# Altium footprint library 3M THD.PcbLib: 163 footprints (part 10 of 14)
Each footprint in its own frame and in the unit in brackets; x right, y up, seen from the top. Pads: shape width x height; smd on the part's side, far side on the other; paste and mask are expansions set on the pad; w line width, h text height; cw(c..) or ccw(c..) is an arc to the next point about the centre after c.
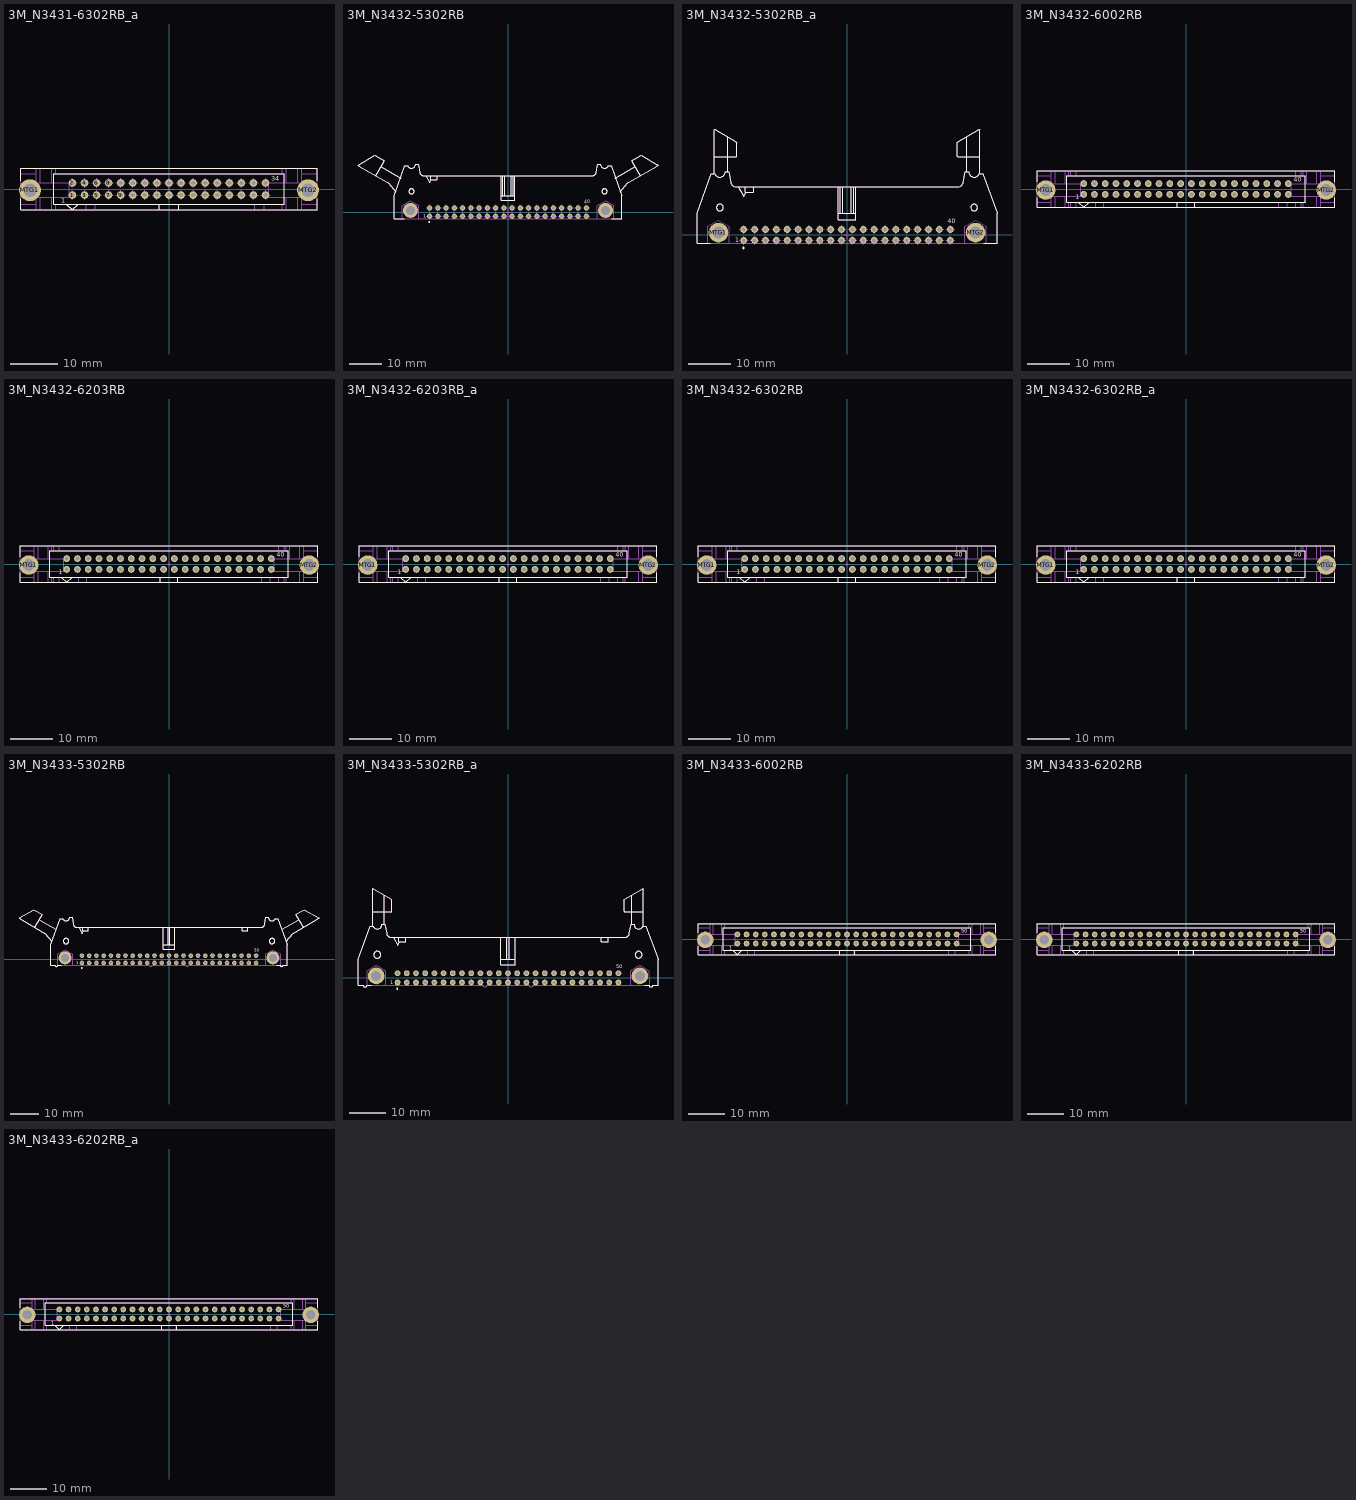
[diagram p9: the footprints below, top view; thin cyan lines are the x and y axes]

## 3M_N3431-6302RB_a [mm] "3M, 3000 Series, 34 Contacts - Pitch 2.54mm - Straight Four-Wall Header (Black) With Long Roll Pin Latch/Ejectors"
height 27.2
pads (36):
  round 1.6 hole 0.9: 1(-20.32,-1.27) 2(-20.32,1.27) 3(-17.78,-1.27) 4(-17.78,1.27) 5(-15.24,-1.27) 6(-15.24,1.27) 7(-12.7,-1.27) 8(-12.7,1.27) 9(-10.16,-1.27) 10(-10.16,1.27) 11(-7.62,-1.27) 12(-7.62,1.27) 13(-5.08,-1.27) 14(-5.08,1.27) 15(-2.54,-1.27) 16(-2.54,1.27) 17(0,-1.27) 18(0,1.27) 19(2.54,-1.27) 20(2.54,1.27) 21(5.08,-1.27) 22(5.08,1.27) 23(7.62,-1.27) 24(7.62,1.27) 25(10.16,-1.27) 26(10.16,1.27) 27(12.7,-1.27) 28(12.7,1.27) 29(15.24,-1.27) 30(15.24,1.27) 31(17.78,-1.27) 32(17.78,1.27) 33(20.32,-1.27) 34(20.32,1.27)
  round 4.6 hole 2.8: MTG1(-29.274,-0.254) MTG2(29.274,-0.254)
Top Overlay:
  lines w0.2: -31.242,-2 -31.242,-4.318 31.242,-4.318 31.242,-2 ; -31.242,1.7 -31.242,4.3 ; -31.242,4.318 31.242,4.318 ; -2.032,-4.318 -2.032,-3.175 ; 2.032,-4.318 2.032,-3.175 ; 31.242,1.7 31.242,4.3 ; -24.257,-3.175 24.257,-3.175 24.257,3.175 -24.257,3.175 -24.257,-3.175 ; -21.59,-3.175 -20.32,-4.318 -19.05,-3.175 -21.59,-3.175
  text "1" at -22.657,-2.921 h1.02
  text "34" at 21.555,1.727 h1.02
Mechanical 8:
  lines w0.1: -21.32,-1.27 -20.32,-1.27 ; -21.32,1.27 -20.32,1.27 ; -20.32,-2.27 -20.32,-1.27 ; -20.32,-0.27 -20.32,-1.27 ; -20.32,0.27 -20.32,1.27 ; -20.32,2.27 -20.32,1.27 ; -19.32,-1.27 -20.32,-1.27 ; -19.32,1.27 -20.32,1.27 ; -18.78,-1.27 -17.78,-1.27 ; -18.78,1.27 -17.78,1.27 ; -17.78,-2.27 -17.78,-1.27 ; -17.78,-0.27 -17.78,-1.27 ; -17.78,0.27 -17.78,1.27 ; -17.78,2.27 -17.78,1.27 ; -16.78,-1.27 -17.78,-1.27 ; -16.78,1.27 -17.78,1.27 ; -16.24,-1.27 -15.24,-1.27 ; -16.24,1.27 -15.24,1.27 ; -15.24,-2.27 -15.24,-1.27 ; -15.24,-0.27 -15.24,-1.27 ; -15.24,0.27 -15.24,1.27 ; -15.24,2.27 -15.24,1.27 ; -14.24,-1.27 -15.24,-1.27 ; -14.24,1.27 -15.24,1.27 ; -13.7,-1.27 -12.7,-1.27 ; -13.7,1.27 -12.7,1.27 ; -12.7,-2.27 -12.7,-1.27 ; -12.7,-0.27 -12.7,-1.27 ; -12.7,0.27 -12.7,1.27 ; -12.7,2.27 -12.7,1.27 ; -11.7,-1.27 -12.7,-1.27 ; -11.7,1.27 -12.7,1.27 ; -11.16,-1.27 -10.16,-1.27 ; -11.16,1.27 -10.16,1.27 ; -10.16,-2.27 -10.16,-1.27 ; -10.16,-0.27 -10.16,-1.27 ; -10.16,0.27 -10.16,1.27 ; -10.16,2.27 -10.16,1.27 ; -9.16,-1.27 -10.16,-1.27 ; -9.16,1.27 -10.16,1.27 ; -8.62,-1.27 -7.62,-1.27 ; -8.62,1.27 -7.62,1.27 ; -7.62,-2.27 -7.62,-1.27 ; -7.62,-0.27 -7.62,-1.27 ; -7.62,0.27 -7.62,1.27 ; -7.62,2.27 -7.62,1.27 ; -6.62,-1.27 -7.62,-1.27 ; -6.62,1.27 -7.62,1.27 ; -6.08,-1.27 -5.08,-1.27 ; -6.08,1.27 -5.08,1.27 ; -5.08,-2.27 -5.08,-1.27 ; -5.08,-0.27 -5.08,-1.27 ; -5.08,0.27 -5.08,1.27 ; -5.08,2.27 -5.08,1.27 ; -4.08,-1.27 -5.08,-1.27 ; -4.08,1.27 -5.08,1.27 ; -3.54,-1.27 -2.54,-1.27 ; -3.54,1.27 -2.54,1.27 ; -2.54,-2.27 -2.54,-1.27 ; -2.54,-0.27 -2.54,-1.27 ; -2.54,0.27 -2.54,1.27 ; -2.54,2.27 -2.54,1.27 ; -1.54,-1.27 -2.54,-1.27 ; -1.54,1.27 -2.54,1.27 ; -1,-1.27 0,-1.27 ; -1,0 0,0 ; -1,1.27 0,1.27 ; 0,-2.27 0,-1.27 ; 0,-1 0,0 ; 0,-0.27 0,-1.27 ; 0,0.27 0,1.27 ; 0,1 0,0 ; 0,2.27 0,1.27 ; 1,-1.27 0,-1.27 ; 1,0 0,0 ; 1,1.27 0,1.27 ; 1.54,-1.27 2.54,-1.27 ; 1.54,1.27 2.54,1.27 ; 2.54,-2.27 2.54,-1.27 ; 2.54,-0.27 2.54,-1.27 ; 2.54,0.27 2.54,1.27 ; 2.54,2.27 2.54,1.27 ; 3.54,-1.27 2.54,-1.27 ; 3.54,1.27 2.54,1.27 ; 4.08,-1.27 5.08,-1.27 ; 4.08,1.27 5.08,1.27 ; 5.08,-2.27 5.08,-1.27 ; 5.08,-0.27 5.08,-1.27 ; 5.08,0.27 5.08,1.27 ; 5.08,2.27 5.08,1.27 ; 6.08,-1.27 5.08,-1.27 ; 6.08,1.27 5.08,1.27 ; 6.62,-1.27 7.62,-1.27 ; 6.62,1.27 7.62,1.27 ; 7.62,-2.27 7.62,-1.27 ; 7.62,-0.27 7.62,-1.27 ; 7.62,0.27 7.62,1.27 ; 7.62,2.27 7.62,1.27 ; 8.62,-1.27 7.62,-1.27 ; 8.62,1.27 7.62,1.27 ; 9.16,-1.27 10.16,-1.27 ; 9.16,1.27 10.16,1.27 ; 10.16,-2.27 10.16,-1.27 ; 10.16,-0.27 10.16,-1.27 ; 10.16,0.27 10.16,1.27 ; 10.16,2.27 10.16,1.27 ; 11.16,-1.27 10.16,-1.27 ; 11.16,1.27 10.16,1.27 ; 11.7,-1.27 12.7,-1.27 ; 11.7,1.27 12.7,1.27 ; 12.7,-2.27 12.7,-1.27 ; 12.7,-0.27 12.7,-1.27 ; 12.7,0.27 12.7,1.27 ; 12.7,2.27 12.7,1.27 ; 13.7,-1.27 12.7,-1.27 ; 13.7,1.27 12.7,1.27 ; 14.24,-1.27 15.24,-1.27 ; 14.24,1.27 15.24,1.27 ; 15.24,-2.27 15.24,-1.27 ; 15.24,-0.27 15.24,-1.27 ; 15.24,0.27 15.24,1.27 ; 15.24,2.27 15.24,1.27 ; 16.24,-1.27 15.24,-1.27 ; 16.24,1.27 15.24,1.27 ; 16.78,-1.27 17.78,-1.27 ; 16.78,1.27 17.78,1.27 ; 17.78,-2.27 17.78,-1.27 ; 17.78,-0.27 17.78,-1.27 ; 17.78,0.27 17.78,1.27 ; 17.78,2.27 17.78,1.27 ; 18.78,-1.27 17.78,-1.27 ; 18.78,1.27 17.78,1.27 ; 19.32,-1.27 20.32,-1.27 ; 19.32,1.27 20.32,1.27 ; 20.32,-2.27 20.32,-1.27 ; 20.32,-0.27 20.32,-1.27 ; 20.32,0.27 20.32,1.27 ; 20.32,2.27 20.32,1.27 ; 21.32,-1.27 20.32,-1.27 ; 21.32,1.27 20.32,1.27
Mechanical 14:
  circle w0.1: c29.274,-0.254 r1.27
  circle w0.1: c-29.274,-0.254 r1.27
  lines w0.1: -31.242,-3.175 -27.914,-3.175 ; -30.274,-0.254 -29.274,-0.254 ; -29.274,-1.254 -29.274,-0.254 ; -29.274,0.746 -29.274,-0.254 ; -28.274,-0.254 -29.274,-0.254 ; -27.914,-4.318 -27.914,-1.727 -20.955,-1.727 -20.955,1.27 -27.914,1.27 -27.914,4.318 ; -27.072,-4.318 -27.072,-1.727 ; -27.072,1.27 -27.072,4.318 ; -24.639,-4.318 -24.638,-1.727 ; -24.257,-1.727 -24.257,-3.175 24.257,-3.175 24.257,-1.727 ; -24.257,1.27 -24.257,3.175 24.257,3.175 24.257,1.27 ; -17.469,-4.318 -17.469,-3.175 ; -15.551,-4.318 -15.551,-3.175 ; -2.032,-4.318 -2.032,-3.175 ; 2.032,-4.318 2.032,-3.175 ; 18.091,-4.318 18.091,-3.175 ; 20.009,-4.318 20.009,-3.175 ; 23.796,-4.318 23.796,-3.175 ; 23.796,3.175 23.796,4.318 ; 24.638,1.27 24.638,4.318 ; 24.679,-4.318 24.679,-1.727 ; 27.072,-4.318 27.072,-1.727 ; 27.072,1.27 27.072,4.318 ; 27.914,-4.318 27.914,-1.727 20.955,-1.727 20.955,1.27 27.914,1.27 27.914,4.318 ; 27.914,-3.175 31.242,-3.175 ; 27.914,3.175 31.242,3.175 ; 28.274,-0.254 29.274,-0.254 ; 29.274,-1.254 29.274,-0.254 ; 29.274,0.746 29.274,-0.254 ; 30.274,-0.254 29.274,-0.254 ; -31.242,-4.318 31.242,-4.318 31.242,4.318 -31.242,4.318 -31.242,-4.318 ; -31.242,3.175 -27.914,3.175 -31.242,3.175 ; -30.798,-1.134 -30.798,0.626 -29.274,1.506 -27.75,0.626 -27.75,-1.134 -29.274,-2.014 -30.798,-1.134 ; -24.638,1.27 -24.638,4.318 -24.638,1.27 ; -23.796,-4.318 -23.796,-3.175 -23.796,-4.318 ; -23.796,3.175 -23.796,4.318 -23.796,3.175 ; -21.59,-3.175 -20.32,-4.318 -19.05,-3.175 -21.59,-3.175 ; 27.75,-1.134 27.75,0.626 29.274,1.506 30.798,0.626 30.798,-1.134 29.274,-2.014 27.75,-1.134
  text "1" at -22.657,-2.921 h1.02
  text "34" at 21.555,1.727 h1.02
3D body "3M_N3431-6302RB_a.stp": height 27.18, standoff -2.84, extent -31.242,-4.318 31.242,4.318

## 3M_N3432-5302RB [mm] "3M, 3000 Series, 40 Contacts - Pitch 2.54mm - Right Angle Four-Wall Header (Black) With Long Roll Pin Latch/Ejectors"
height 8.6
pads (42):
  round 1.6 hole 0.9: 1(-24.13,-1.27) 2(-24.13,1.27) 3(-21.59,-1.27) 4(-21.59,1.27) 5(-19.05,-1.27) 6(-19.05,1.27) 7(-16.51,-1.27) 8(-16.51,1.27) 9(-13.97,-1.27) 10(-13.97,1.27) 11(-11.43,-1.27) 12(-11.43,1.27) 13(-8.89,-1.27) 14(-8.89,1.27) 15(-6.35,-1.27) 16(-6.35,1.27) 17(-3.81,-1.27) 18(-3.81,1.27) 19(-1.27,-1.27) 20(-1.27,1.27) 21(1.27,-1.27) 22(1.27,1.27) 23(3.81,-1.27) 24(3.81,1.27) 25(6.35,-1.27) 26(6.35,1.27) 27(8.89,-1.27) 28(8.89,1.27) 29(11.43,-1.27) 30(11.43,1.27) 31(13.97,-1.27) 32(13.97,1.27) 33(16.51,-1.27) 34(16.51,1.27) 35(19.05,-1.27) 36(19.05,1.27) 37(21.59,-1.27) 38(21.59,1.27) 39(24.13,-1.27) 40(24.13,1.27)
  round 4.6 hole 2.8: MTG1(-30.036,0.533) MTG2(30.042,0.533)
Top Overlay:
  circle w0.2: c-29.718,6.375 r0.787
  circle w0.2: c29.718,6.375 r0.787
  circle w0.2: c-24.203,-3.048 r0.15
  lines w0.2: -40.655,11.145 -38.077,15.611 ccw(c-38.165,15.662) -38.114,15.75 -41.028,17.432 -46.134,14.485 ccw(c-46.083,14.397) -46.134,14.309 -36.947,9.005 -34.635,6.25 ; -39.042,13.939 -33.088,10.502 ; -31.94,-2.007 -35.052,-2.007 -35.052,5.105 -31.724,14.249 -30.882,14.249 ccw(c-29.718,14.757) -28.448,14.757 -27.606,14.757 -27.164,12.251 ccw(c-25.913,12.471) -25.913,11.201 25.913,11.201 ccw(c25.913,12.471) 27.164,12.251 27.606,14.757 28.448,14.757 ccw(c29.718,14.757) 30.882,14.249 31.724,14.249 35.052,5.105 35.052,-2.007 31.94,-2.007 ; -25.394,11.201 -24.124,9.002 -23.587,9.931 ; -23.819,11.201 -23.819,9.931 -21.901,9.931 -21.908,11.201 ; -2.032,5.105 2.032,5.105 ; -2.032,11.201 -2.032,3.581 2.032,3.581 2.032,11.201 ; -1.581,5.105 -1.581,11.201 ; -0.946,5.105 -0.946,11.201 ; 0.959,5.105 0.959,11.201 ; 1.594,5.105 1.594,11.201 ; 33.088,10.502 39.042,13.939 ; 34.635,6.25 36.947,9.005 46.134,14.309 ccw(c46.083,14.397) 46.134,14.485 41.028,17.432 38.114,15.75 ccw(c38.165,15.662) 38.077,15.611 40.655,11.145
  text "1" at -26.162,-1.7 h1.02
  text "40" at 23.495,2.667 h1.02
Mechanical 8:
  drawing of 172 lines, arcs and shapes, not listed
Mechanical 14:
  circle w0.1: c-30.036,0.533 r1.27
  circle w0.1: c-29.718,6.375 r0.787
  circle w0.1: c30.036,0.533 r1.27
  circle w0.1: c29.718,6.375 r0.787
  lines w0.1: -40.655,11.145 -38.077,15.611 ccw(c-38.165,15.662) -38.114,15.75 -41.028,17.432 -46.134,14.485 ccw(c-46.083,14.397) -46.134,14.309 -36.947,9.005 -34.635,6.25 ; -39.042,13.939 -33.088,10.502 ; -32.537,-2.007 -32.537,1.978 -30.036,3.422 -27.534,1.978 -27.534,-2.007 ; -25.394,11.201 -24.124,9.002 -23.587,9.931 ; -23.819,11.201 -23.819,9.931 -21.901,9.931 -21.908,11.201 ; -2.032,5.105 2.032,5.105 ; -2.032,11.201 -2.032,3.581 2.032,3.581 2.032,11.201 ; -1.581,5.105 -1.581,11.201 ; -0.946,5.105 -0.946,11.201 ; 0.959,5.105 0.959,11.201 ; 1.594,5.105 1.594,11.201 ; 27.534,-2.007 27.534,1.978 30.036,3.422 32.537,1.978 32.537,-2.007 ; 33.088,10.502 39.042,13.939 ; 34.635,6.25 36.947,9.005 46.134,14.309 ccw(c46.083,14.397) 46.134,14.485 41.028,17.432 38.114,15.75 ccw(c38.165,15.662) 38.077,15.611 40.655,11.145 ; -35.052,-2.007 -35.052,5.105 -31.724,14.249 -30.882,14.249 ccw(c-29.718,14.757) -28.448,14.757 -27.606,14.757 -27.164,12.251 ccw(c-25.913,12.471) -25.913,11.201 25.913,11.201 ccw(c25.913,12.471) 27.164,12.251 27.606,14.757 28.448,14.757 ccw(c29.718,14.757) 30.882,14.249 31.724,14.249 35.052,5.105 35.052,-2.007 -35.052,-2.007
  text "1" at -26.162,-1.7 h1.02
  text "40" at 23.495,2.667 h1.02
3D body "3M_N3432-5302RB.stp": height 8.64, standoff -2.84, extent -46.178,-2.532 46.178,17.43

## 3M_N3432-5302RB_a [mm] "3M, 3000 Series, 40 Contacts - Pitch 2.54mm - Right Angle Four-Wall Header (Black) With Long Roll Pin Latch/Ejectors"
height 8.6
pads (42):
  round 1.6 hole 0.9: 1(-24.13,-1.27) 2(-24.13,1.27) 3(-21.59,-1.27) 4(-21.59,1.27) 5(-19.05,-1.27) 6(-19.05,1.27) 7(-16.51,-1.27) 8(-16.51,1.27) 9(-13.97,-1.27) 10(-13.97,1.27) 11(-11.43,-1.27) 12(-11.43,1.27) 13(-8.89,-1.27) 14(-8.89,1.27) 15(-6.35,-1.27) 16(-6.35,1.27) 17(-3.81,-1.27) 18(-3.81,1.27) 19(-1.27,-1.27) 20(-1.27,1.27) 21(1.27,-1.27) 22(1.27,1.27) 23(3.81,-1.27) 24(3.81,1.27) 25(6.35,-1.27) 26(6.35,1.27) 27(8.89,-1.27) 28(8.89,1.27) 29(11.43,-1.27) 30(11.43,1.27) 31(13.97,-1.27) 32(13.97,1.27) 33(16.51,-1.27) 34(16.51,1.27) 35(19.05,-1.27) 36(19.05,1.27) 37(21.59,-1.27) 38(21.59,1.27) 39(24.13,-1.27) 40(24.13,1.27)
  round 4.6 hole 2.8: MTG1(-30.036,0.533) MTG2(30.042,0.533)
Top Overlay:
  circle w0.2: c-29.718,6.375 r0.787
  circle w0.2: c29.718,6.375 r0.787
  circle w0.2: c-24.203,-3.048 r0.15
  lines w0.2: -31.94,-2.007 -35.052,-2.007 -35.052,5.105 -31.724,14.249 -30.882,14.249 ccw(c-29.718,14.757) -28.448,14.757 -27.606,14.757 -27.164,12.251 ccw(c-25.913,12.471) -25.913,11.201 25.913,11.201 ccw(c25.913,12.471) 27.164,12.251 27.606,14.757 28.448,14.757 ccw(c29.718,14.757) 30.882,14.249 31.724,14.249 35.052,5.105 35.052,-2.007 31.94,-2.007 ; -31.039,14.249 -31.039,24.561 -30.886,24.649 -25.781,21.702 -25.781,18.336 -25.883,18.235 -31.039,18.235 ; -27.813,14.757 -27.813,22.875 ; -25.394,11.201 -24.124,9.002 -23.587,9.931 ; -23.819,11.201 -23.819,9.931 -21.901,9.931 -21.908,11.201 ; -2.032,5.105 2.032,5.105 ; -2.032,11.201 -2.032,3.581 2.032,3.581 2.032,11.201 ; -1.581,5.105 -1.581,11.201 ; -0.946,5.105 -0.946,11.201 ; 0.959,5.105 0.959,11.201 ; 1.594,5.105 1.594,11.201 ; 27.837,14.757 27.837,22.875 ; 31.039,14.249 31.039,24.561 30.886,24.649 25.781,21.702 25.781,18.336 25.883,18.235 31.039,18.235
  text "1" at -26.162,-1.7 h1.02
  text "40" at 23.495,2.667 h1.02
Mechanical 8:
  drawing of 172 lines, arcs and shapes, not listed
Mechanical 14:
  circle w0.1: c-30.036,0.533 r1.27
  circle w0.1: c-29.718,6.375 r0.787
  circle w0.1: c30.036,0.533 r1.27
  circle w0.1: c29.718,6.375 r0.787
  lines w0.1: -32.537,-2.007 -32.537,1.978 -30.036,3.422 -27.534,1.978 -27.534,-2.007 ; -31.039,14.249 -31.039,24.561 -30.886,24.649 -25.781,21.702 -25.781,18.336 -25.883,18.235 -31.039,18.235 ; -27.813,14.757 -27.813,22.875 ; -25.394,11.201 -24.124,9.002 -23.587,9.931 ; -23.819,11.201 -23.819,9.931 -21.901,9.931 -21.908,11.201 ; -2.032,5.105 2.032,5.105 ; -2.032,11.201 -2.032,3.581 2.032,3.581 2.032,11.201 ; -1.581,5.105 -1.581,11.201 ; -0.946,5.105 -0.946,11.201 ; 0.959,5.105 0.959,11.201 ; 1.594,5.105 1.594,11.201 ; 27.534,-2.007 27.534,1.978 30.036,3.422 32.537,1.978 32.537,-2.007 ; 27.837,14.757 27.837,22.875 ; 31.039,14.249 31.039,24.561 30.886,24.649 25.781,21.702 25.781,18.336 25.883,18.235 31.039,18.235 ; -35.052,-2.007 -35.052,5.105 -31.724,14.249 -30.882,14.249 ccw(c-29.718,14.757) -28.448,14.757 -27.606,14.757 -27.164,12.251 ccw(c-25.913,12.471) -25.913,11.201 25.913,11.201 ccw(c25.913,12.471) 27.164,12.251 27.606,14.757 28.448,14.757 ccw(c29.718,14.757) 30.882,14.249 31.724,14.249 35.052,5.105 35.052,-2.007 -35.052,-2.007
  text "1" at -26.162,-1.7 h1.02
  text "40" at 23.495,2.667 h1.02
3D body "3M_N3432-5302RB_a.stp": height 8.64, standoff -2.84, extent -35.052,-2.532 35.052,24.645

## 3M_N3432-6002RB [mm] "3M, 3000 Series, 40 Contacts - Pitch 2.54mm - Straight Four-Wall Header (Black) Without Roll Pin and Latch/Ejectors Installed"
height 17.3
pads (42):
  round 1.6 hole 0.9: 1(-24.13,-1.27) 2(-24.13,1.27) 3(-21.59,-1.27) 4(-21.59,1.27) 5(-19.05,-1.27) 6(-19.05,1.27) 7(-16.51,-1.27) 8(-16.51,1.27) 9(-13.97,-1.27) 10(-13.97,1.27) 11(-11.43,-1.27) 12(-11.43,1.27) 13(-8.89,-1.27) 14(-8.89,1.27) 15(-6.35,-1.27) 16(-6.35,1.27) 17(-3.81,-1.27) 18(-3.81,1.27) 19(-1.27,-1.27) 20(-1.27,1.27) 21(1.27,-1.27) 22(1.27,1.27) 23(3.81,-1.27) 24(3.81,1.27) 25(6.35,-1.27) 26(6.35,1.27) 27(8.89,-1.27) 28(8.89,1.27) 29(11.43,-1.27) 30(11.43,1.27) 31(13.97,-1.27) 32(13.97,1.27) 33(16.51,-1.27) 34(16.51,1.27) 35(19.05,-1.27) 36(19.05,1.27) 37(21.59,-1.27) 38(21.59,1.27) 39(24.13,-1.27) 40(24.13,1.27)
  round 4.6 hole 2.8: MTG1(-33.07,-0.25) MTG2(33.07,-0.25)
Top Overlay:
  lines w0.2: -35.052,-2.102 -35.052,-4.318 35.052,-4.318 35.052,-2.102 ; -35.052,1.704 -35.052,4.304 ; -35.052,4.318 35.052,4.318 ; -2.032,-4.318 -2.032,-3.175 ; 2.032,-4.318 2.032,-3.175 ; 35.052,1.704 35.052,4.304 ; -28.067,-3.175 -28.067,3.175 28.067,3.175 28.067,-3.175 -28.067,-3.175 ; -25.4,-3.175 -24.13,-4.318 -22.86,-3.175 -25.4,-3.175
  text "40" at 25.365,1.727 h1
  text "1" at -25.992,-2.446 h1
Mechanical 8:
  drawing of 172 lines, arcs and shapes, not listed
Mechanical 14:
  circle w0.1: c33.084,-0.254 r1.27
  circle w0.1: c-33.084,-0.254 r1.27
  lines w0.1: -35.052,-3.175 -31.724,-3.175 ; -35.052,3.175 -31.724,3.175 ; -31.724,-4.318 -31.724,-1.727 -24.765,-1.727 -24.765,1.27 -31.724,1.27 -31.724,4.318 ; -30.882,-4.318 -30.882,-1.727 ; -30.882,1.27 -30.882,4.318 ; -28.448,-4.318 -28.448,-1.727 ; -28.448,1.27 -28.448,4.318 ; -28.067,-1.727 -28.067,-3.175 28.067,-3.175 28.067,-1.727 ; -28.067,1.27 -28.067,3.175 28.067,3.175 28.067,1.27 ; -27.606,-4.318 -27.606,-3.175 ; -27.606,3.175 -27.606,4.318 ; -27.164,-4.318 -27.164,-3.175 ; -27.164,3.175 -27.164,4.318 ; -25.913,-4.318 -25.913,-3.175 ; -25.913,3.175 -25.913,4.318 ; -21.279,-4.318 -21.279,-3.175 ; -19.361,-4.318 -19.361,-3.175 ; -2.032,-4.318 -2.032,-3.175 ; 2.032,-4.318 2.032,-3.175 ; 21.901,-4.318 21.901,-3.175 ; 23.819,-4.318 23.819,-3.175 ; 25.913,-4.318 25.913,-3.175 ; 25.913,3.175 25.913,4.318 ; 27.164,-4.318 27.164,-3.175 ; 27.164,3.175 27.164,4.318 ; 27.606,-4.318 27.606,-3.175 ; 27.606,3.175 27.606,4.318 ; 28.493,1.27 28.493,4.318 ; 30.882,-4.318 30.882,-1.727 ; 30.882,1.27 30.882,4.318 ; 31.724,-4.318 31.724,-1.727 24.765,-1.727 24.765,1.27 31.724,1.27 31.724,4.318 ; 31.724,-3.175 35.052,-3.175 ; 31.724,3.175 35.052,3.175 ; -35.052,-4.318 -35.052,4.318 35.052,4.318 35.052,-4.318 -35.052,-4.318 ; -34.608,-1.134 -34.608,0.626 -33.084,1.506 -31.56,0.626 -31.56,-1.134 -33.084,-2.014 -34.608,-1.134 ; 31.56,-1.134 31.56,0.626 33.084,1.506 34.608,0.626 34.608,-1.134 33.084,-2.014 31.56,-1.134
  text "40" at 25.365,1.727 h1
  text "1" at -26,-1.2 h1
3D body "3M_N3432_6002RB.stp": height 17.27, standoff -2.84, extent -35.052,-4.318 35.052,4.318

## 3M_N3432-6203RB [mm] "3M, 3000 Series, 40 Contacts - Pitch 2.54mm - Straight Four-Wall Header (Black) With Short Roll Pin and Latch/Ejectors Installed, Solder Tail 3.94mm"
height 24.6
pads (42):
  round 1.6 hole 0.9: 1(-24.13,-1.27) 2(-24.13,1.27) 3(-21.59,-1.27) 4(-21.59,1.27) 5(-19.05,-1.27) 6(-19.05,1.27) 7(-16.51,-1.27) 8(-16.51,1.27) 9(-13.97,-1.27) 10(-13.97,1.27) 11(-11.43,-1.27) 12(-11.43,1.27) 13(-8.89,-1.27) 14(-8.89,1.27) 15(-6.35,-1.27) 16(-6.35,1.27) 17(-3.81,-1.27) 18(-3.81,1.27) 19(-1.27,-1.27) 20(-1.27,1.27) 21(1.27,-1.27) 22(1.27,1.27) 23(3.81,-1.27) 24(3.81,1.27) 25(6.35,-1.27) 26(6.35,1.27) 27(8.89,-1.27) 28(8.89,1.27) 29(11.43,-1.27) 30(11.43,1.27) 31(13.97,-1.27) 32(13.97,1.27) 33(16.51,-1.27) 34(16.51,1.27) 35(19.05,-1.27) 36(19.05,1.27) 37(21.59,-1.27) 38(21.59,1.27) 39(24.13,-1.27) 40(24.13,1.27)
  round 4.6 hole 2.8: MTG1(-33.07,-0.25) MTG2(33.07,-0.25)
Top Overlay:
  lines w0.2: -35.052,-2.102 -35.052,-4.318 35.052,-4.318 35.052,-2.102 ; -35.052,1.704 -35.052,4.304 ; -35.052,4.318 35.052,4.318 ; -2.032,-4.318 -2.032,-3.175 ; 2.032,-4.318 2.032,-3.175 ; 35.052,1.704 35.052,4.304 ; -28.067,-3.175 28.067,-3.175 28.067,3.175 -28.067,3.175 -28.067,-3.175 ; -25.4,-3.175 -22.86,-3.175 -24.13,-4.318 -25.4,-3.175
  text "1" at -25.992,-2.446 h1
  text "40" at 25.365,1.727 h1
Mechanical 8:
  drawing of 172 lines, arcs and shapes, not listed
Mechanical 14:
  circle w0.1: c-33.084,-0.254 r1.27
  circle w0.1: c33.084,-0.254 r1.27
  lines w0.1: -35.052,-3.175 -31.724,-3.175 ; -35.052,3.175 -31.724,3.175 ; -31.724,-4.318 -31.724,-1.727 -24.765,-1.727 -24.765,1.27 -31.724,1.27 -31.724,4.318 ; -30.882,-4.318 -30.882,-1.727 ; -30.882,1.27 -30.882,4.318 ; -28.448,-4.318 -28.448,-1.727 ; -28.448,1.27 -28.448,4.318 ; -28.067,-1.727 -28.067,-3.175 28.067,-3.175 28.067,-1.727 ; -28.067,1.27 -28.067,3.175 28.067,3.175 28.067,1.27 ; -27.606,-4.318 -27.606,-3.175 ; -27.606,3.175 -27.606,4.318 ; -27.164,-4.318 -27.164,-3.175 ; -27.164,3.175 -27.164,4.318 ; -25.913,-4.318 -25.913,-3.175 ; -25.913,3.175 -25.913,4.318 ; -21.279,-4.318 -21.279,-3.175 ; -19.361,-4.318 -19.361,-3.175 ; -2.032,-4.318 -2.032,-3.175 ; 2.032,-4.318 2.032,-3.175 ; 21.901,-4.318 21.901,-3.175 ; 23.819,-4.318 23.819,-3.175 ; 25.913,-4.318 25.913,-3.175 ; 25.913,3.175 25.913,4.318 ; 27.164,-4.318 27.164,-3.175 ; 27.164,3.175 27.164,4.318 ; 27.606,-4.318 27.606,-3.175 ; 27.606,3.175 27.606,4.318 ; 28.493,1.27 28.493,4.318 ; 30.882,-4.318 30.882,-1.727 ; 30.882,1.27 30.882,4.318 ; 31.724,-4.318 31.724,-1.727 24.765,-1.727 24.765,1.27 31.724,1.27 31.724,4.318 ; 31.724,-3.175 35.052,-3.175 ; 31.724,3.175 35.052,3.175 ; -35.052,-4.318 35.052,-4.318 35.052,4.318 -35.052,4.318 -35.052,-4.318 ; -34.608,-1.134 -33.084,-2.014 -31.56,-1.134 -31.56,0.626 -33.084,1.506 -34.608,0.626 -34.608,-1.134 ; 31.56,-1.134 33.084,-2.014 34.608,-1.134 34.608,0.626 33.084,1.506 31.56,0.626 31.56,-1.134
  text "1" at -26,-1.2 h1
  text "40" at 25.365,1.727 h1
3D body "3M_N3432-6203RB.stp": height 18.69, standoff -3.94, extent -43.981,-4.318 43.981,4.318

## 3M_N3432-6203RB_a [mm] "3M, 3000 Series, 40 Contacts - Pitch 2.54mm - Straight Four-Wall Header (Black) With Short Roll Pin and Latch/Ejectors Installed, Solder Tail 3.94mm"
height 24.6
pads (42):
  round 1.6 hole 0.9: 1(-24.13,-1.27) 2(-24.13,1.27) 3(-21.59,-1.27) 4(-21.59,1.27) 5(-19.05,-1.27) 6(-19.05,1.27) 7(-16.51,-1.27) 8(-16.51,1.27) 9(-13.97,-1.27) 10(-13.97,1.27) 11(-11.43,-1.27) 12(-11.43,1.27) 13(-8.89,-1.27) 14(-8.89,1.27) 15(-6.35,-1.27) 16(-6.35,1.27) 17(-3.81,-1.27) 18(-3.81,1.27) 19(-1.27,-1.27) 20(-1.27,1.27) 21(1.27,-1.27) 22(1.27,1.27) 23(3.81,-1.27) 24(3.81,1.27) 25(6.35,-1.27) 26(6.35,1.27) 27(8.89,-1.27) 28(8.89,1.27) 29(11.43,-1.27) 30(11.43,1.27) 31(13.97,-1.27) 32(13.97,1.27) 33(16.51,-1.27) 34(16.51,1.27) 35(19.05,-1.27) 36(19.05,1.27) 37(21.59,-1.27) 38(21.59,1.27) 39(24.13,-1.27) 40(24.13,1.27)
  round 4.6 hole 2.8: MTG1(-33.07,-0.25) MTG2(33.07,-0.25)
Top Overlay:
  lines w0.2: -35.052,-2.102 -35.052,-4.318 35.052,-4.318 35.052,-2.102 ; -35.052,1.704 -35.052,4.304 ; -35.052,4.318 35.052,4.318 ; -2.032,-4.318 -2.032,-3.175 ; 2.032,-4.318 2.032,-3.175 ; 35.052,1.704 35.052,4.304 ; -28.067,-3.175 -28.067,3.175 28.067,3.175 28.067,-3.175 -28.067,-3.175 ; -25.4,-3.175 -24.13,-4.318 -22.86,-3.175 -25.4,-3.175
  text "40" at 25.365,1.727 h1
  text "1" at -25.992,-2.446 h1
Mechanical 8:
  drawing of 172 lines, arcs and shapes, not listed
Mechanical 14:
  circle w0.1: c33.084,-0.254 r1.27
  circle w0.1: c-33.084,-0.254 r1.27
  lines w0.1: -35.052,-3.175 -31.724,-3.175 ; -35.052,3.175 -31.724,3.175 ; -31.724,-4.318 -31.724,-1.727 -24.765,-1.727 -24.765,1.27 -31.724,1.27 -31.724,4.318 ; -30.882,-4.318 -30.882,-1.727 ; -30.882,1.27 -30.882,4.318 ; -28.448,-4.318 -28.448,-1.727 ; -28.448,1.27 -28.448,4.318 ; -28.067,-1.727 -28.067,-3.175 28.067,-3.175 28.067,-1.727 ; -28.067,1.27 -28.067,3.175 28.067,3.175 28.067,1.27 ; -27.606,-4.318 -27.606,-3.175 ; -27.606,3.175 -27.606,4.318 ; -27.164,-4.318 -27.164,-3.175 ; -27.164,3.175 -27.164,4.318 ; -25.913,-4.318 -25.913,-3.175 ; -25.913,3.175 -25.913,4.318 ; -21.279,-4.318 -21.279,-3.175 ; -19.361,-4.318 -19.361,-3.175 ; -2.032,-4.318 -2.032,-3.175 ; 2.032,-4.318 2.032,-3.175 ; 21.901,-4.318 21.901,-3.175 ; 23.819,-4.318 23.819,-3.175 ; 25.913,-4.318 25.913,-3.175 ; 25.913,3.175 25.913,4.318 ; 27.164,-4.318 27.164,-3.175 ; 27.164,3.175 27.164,4.318 ; 27.606,-4.318 27.606,-3.175 ; 27.606,3.175 27.606,4.318 ; 28.493,1.27 28.493,4.318 ; 30.882,-4.318 30.882,-1.727 ; 30.882,1.27 30.882,4.318 ; 31.724,-4.318 31.724,-1.727 24.765,-1.727 24.765,1.27 31.724,1.27 31.724,4.318 ; 31.724,-3.175 35.052,-3.175 ; 31.724,3.175 35.052,3.175 ; -35.052,-4.318 -35.052,4.318 35.052,4.318 35.052,-4.318 -35.052,-4.318 ; -34.608,-1.134 -34.608,0.626 -33.084,1.506 -31.56,0.626 -31.56,-1.134 -33.084,-2.014 -34.608,-1.134 ; 31.56,-1.134 31.56,0.626 33.084,1.506 34.608,0.626 34.608,-1.134 33.084,-2.014 31.56,-1.134